# Altium footprint library CUSTOM PCB.PcbLib: 404 footprints (part 1 of 26)
Each footprint in its own frame and in the unit in brackets; x right, y up, seen from the top. Pads: shape width x height; smd on the part's side, far side on the other; paste and mask are expansions set on the pad; w line width, h text height; cw(c..) or ccw(c..) is an arc to the next point about the centre after c.
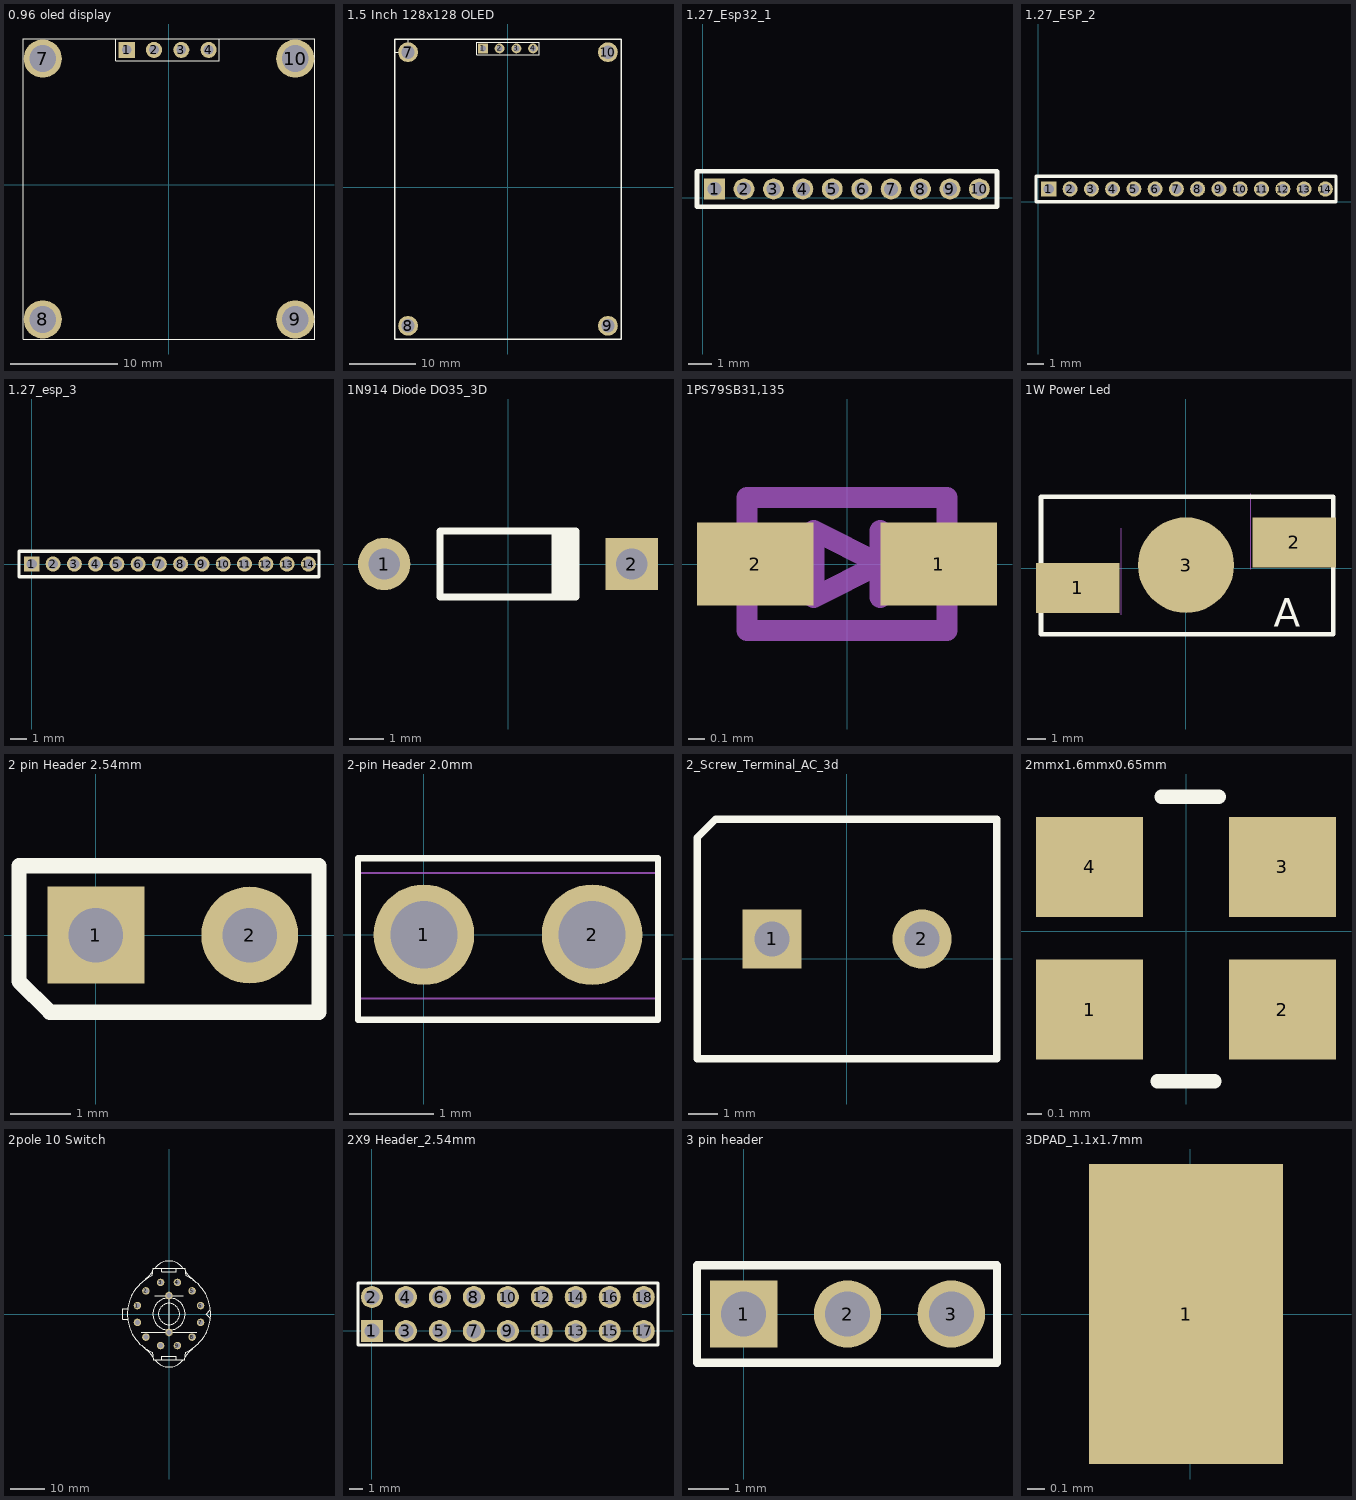
[diagram p0: the footprints below, top view; thin cyan lines are the x and y axes]

## 0.96 oled display [mm] "Connector; Header; 4 Position"
pads (8):
  rect 1.5x1.5 hole 0.9: 1(-3.937,12.547)
  round 1.5 hole 0.9: 2(-1.397,12.547) 3(1.143,12.547) 4(3.683,12.547)
  round 3.556 hole 2.5: 7(-11.759,11.734) 8(-11.759,-12.547) 9(11.759,-12.547) 10(11.759,11.734)
Top Overlay:
  lines w0.05: 11.303,11.734 11.505,11.734
  lines w0.1: -3.937,13.563 -13.589,13.563 ; -13.589,13.563 13.589,13.563 13.589,-14.377 -13.589,-14.377 -13.589,13.563 ; -4.953,11.531 -4.953,13.563 4.699,13.563 4.699,11.531 -4.953,11.531

## 1.5 Inch 128x128 OLED [mm] "Connector; Header; 4 Position"
pads (8):
  rect 1.5x1.5 hole 0.9: 1(-3.81,21.035)
  round 1.5 hole 0.9: 2(-1.27,21.035) 3(1.27,21.035) 4(3.81,21.035)
  round 3 hole 2: 7(-15.15,20.465) 8(-15.15,-21.035) 9(15.15,-21.035) 10(15.15,20.465)
Top Overlay:
  lines w0.1: -17.15,20.465 -15.15,20.465 -15.15,22.465 ; -4.75,20.066 4.75,20.066 4.75,21.971 -4.75,21.971 -4.75,20.066
  lines w0.2: -17.15,-23.035 -17.15,22.465 17.15,22.465 17.15,-23.035 -17.15,-23.035

## 1.27_Esp32_1 [mm] "10 pin 1.27mm Pitch esp32_1"
pads (10):
  rect 0.9x0.9 hole 0.6: 1(0.508,0.381)
  round 0.9 hole 0.6: 2(1.778,0.381) 3(3.048,0.381) 4(4.318,0.381) 5(5.588,0.381) 6(6.858,0.381) 7(8.128,0.381) 8(9.398,0.381) 9(10.668,0.381) 10(11.938,0.381)
Top Overlay:
  lines w0.2: -0.254,-0.381 12.7,-0.381 12.7,1.143 -0.254,1.143 -0.254,-0.381

## 1.27_ESP_2 [mm] "1.27mm pack, front left 14 pin connector"
pads (14):
  rect 0.9x0.9 hole 0.6: 1(0.635,0.762)
  round 0.9 hole 0.6: 2(1.905,0.762) 3(3.175,0.762) 4(4.445,0.762) 5(5.715,0.762) 6(6.985,0.762) 7(8.255,0.762) 8(9.525,0.762) 9(10.795,0.762) 10(12.065,0.762) 11(13.335,0.762) 12(14.605,0.762) 13(15.875,0.762) 14(17.145,0.762)
Top Overlay:
  lines w0.2: -0.127,0 -0.127,1.524 17.78,1.524 17.78,0 -0.127,0

## 1.27_esp_3 [mm] "front_right esp soc 1.27 pack headers"
pads (14):
  rect 0.9x0.9 hole 0.6: 1(0,0)
  round 0.9 hole 0.6: 2(1.27,0) 3(2.54,0) 4(3.81,0) 5(5.08,0) 6(6.35,0) 7(7.62,0) 8(8.89,0) 9(10.16,0) 10(11.43,0) 11(12.7,0) 12(13.97,0) 13(15.24,0) 14(16.51,0)
Top Overlay:
  lines w0.2: -0.762,-0.762 17.145,-0.762 17.145,0.762 -0.762,0.762 -0.762,-0.762

## 1N914 Diode DO35_3D [mm] "1n914 diode with 3d pac"
pads (2):
  round 1.5 hole 0.9: 1(-3.55,0)
  rect 1.5x1.5 hole 0.9: 2(3.55,0)
Top Overlay:
  rectangle: 1.25,-0.95 2.05,0.95
  lines w0.2: 1.95,-0.95 -1.95,-0.95 -1.95,0.95 1.95,0.95
3D body: height 0.25, standoff 0, extent -0.762,0.127 -0.762,0.127
3D body: height 0.25, standoff 0, extent -0.762,0.127 -0.762,0.127
3D body: height 0.25, standoff 0, extent -4.064,-3.048 -4.064,-3.048
3D body: height 0.25, standoff 0, extent -1.397,0.508 -1.397,0.508
3D body "DO-35_7mm.STEP": height 2.2, standoff -0.7, extent -3.78,-0.925 3.78,0.925

## 1PS79SB31,135 [mm]
pads (2):
  rect 0.7x0.5 smd: 1(0.55,0) 2(-0.55,0)
Mechanical 4:
  region: 0.6,0.15 0.8,0.15 0.8,-0.15 0.6,-0.15
  region: -0.801,0.15 -0.6,0.15 -0.6,-0.15 -0.801,-0.15
  region: 0.6,0.15 0.8,0.15 0.8,-0.15 0.6,-0.15
  region: -0.801,0.15 -0.6,0.15 -0.6,-0.15 -0.801,-0.15
  lines w0.127: -0.6,-0.4 0.6,-0.4 ; -0.6,-0.4 -0.6,0.4 ; -0.6,-0.4 0.6,-0.4 ; -0.6,-0.4 -0.6,0.4 ; -0.6,0.4 0.6,0.4 ; -0.6,0.4 0.6,0.4 ; -0.2,-0.2 0.2,0 ; -0.2,-0.2 -0.2,0.2 ; -0.2,-0.2 0.2,0 ; -0.2,-0.2 -0.2,0.2 ; -0.2,0.2 0.2,0 ; -0.2,0.2 0.2,0 ; 0.2,0 0.2,-0.2 0.2,0 ; 0.2,0 0.2,0.2 0.2,0 ; 0.6,-0.4 0.6,0.4 ; 0.6,-0.4 0.6,0.4

## 1W Power Led [mm]
pads (3):
  rect 4.5x2.7 smd: 1(-5.791,-1.047) 2(5.842,1.403)
  round 5.15 smd: 3(0.025,0.178)
Top Overlay:
  lines w0.254: -7.772,-3.531 -7.772,3.861 7.95,3.861 7.95,-3.531 -7.772,-3.531
  text "A" at 4.75,-3.124 h1.52
Mechanical 4:
  lines w0.025: -3.454,-2.489 -3.454,2.159 ; 3.505,-0.051 3.505,4.013
3D body "Power Led.stp": height 5.05, standoff 0, extent -7.275,-3.823 7.625,4.127

## 2 pin Header 2.54mm [mm]
pads (2):
  rect 1.6x1.6 hole 0.9: 1(0,0)
  round 1.6 hole 0.9: 2(2.54,0)
Top Overlay:
  lines w0.254: -1.27,-0.762 -0.762,-1.27 3.683,-1.27 3.683,1.143 -1.27,1.143 -1.27,-0.762
3D body: height 0.25, standoff 0, extent 0.635,-0.889 0.635,-0.889
3D body "User Library-2PIN.SLDPRT": height 8.1, standoff -2.9, extent -1.27,-1.27 3.81,1.27

## 2-pin Header 2.0mm [mm]
pads (2):
  round 1.2 hole 0.8: 1(0,0) 2(2.007,0)
Top Overlay:
  lines w0.076: -0.787,-1.016 -0.787,0.914 2.794,0.914 2.794,-1.016 -0.787,-1.016
Mechanical 1:
  lines w0.025: -0.787,-0.762 2.794,-0.762 2.794,0.737 -0.787,0.737 -0.787,-0.762

## 2_Screw_Terminal_AC_3d [mm]
pads (2):
  rect 2x2 hole 1.2: 1(-2.538,0.666)
  round 2 hole 1.2: 2(2.542,0.666)
Top Overlay:
  lines w0.254: -5.078,-3.398 -5.078,4.095 -4.443,4.73 5.082,4.73 5.082,-3.398 -5.078,-3.398
3D body "Screw Terminal Block 5mm.SLDPRT": height 12.6, standoff -4.3, extent -5.046,-3.793 5.554,5.207
3D body: height 0.25, standoff 0, extent 0.002,0.666 0.002,0.666

## 2mmx1.6mmx0.65mm [mm]
pads (4):
  rect 0.75x0.7 smd: 1(-0.675,-0.55) 2(0.675,-0.55) 3(0.675,0.45) 4(-0.675,0.45)
Top Overlay:
  lines w0.1: -0.2,-1.05 0.2,-1.05 ; -0.171,0.94 0.229,0.94
  text "." at -1.397,-0.61 h0.8
3D body "User Library-XRCGB27M000F2P00R0.X_T": height 0.65, standoff 0, extent -1,-0.749 1,0.851

## 2pole 10 Switch [mil]
pads (14):
  round 86 hole 59.06: 1(-361.27,96.8) 2(-264.47,264.47) 3(-96.8,361.27) 4(96.8,361.27) 5(264.47,264.47) 6(361.27,96.8) 7(361.27,-96.8) 8(264.47,-264.47) 9(96.8,-361.27) 10(-96.8,-361.27) 11(-264.47,-264.47) 12(-361.27,-96.8) 13(-1,211) 15(0,-210)
Top Overlay:
  circle w8: c0,0 r184.06
  circle w8: c0,0 r121.06
  lines w1: -316,-210 318,-210 0,-210 ; -162,211 161,211 -1,211 ; 0,-255 0,255.89
  lines w8: -478.35,58.07 -530.51,58.07 -530.51,-58.07 -476.38,-58.07 ; -277.35,-387.99 cw(c-800.75,-949.26) -187.84,-487.4 ; -277.35,387.99 ccw(c-800.75,949.26) -187.84,487.4 ; -194.14,-436.59 cw(c0,-0.55) -194.14,435.48 ; -192.91,436.02 -180.12,524.61 180.12,524.61 191.93,437.99 ; -191.93,-437.99 -180.12,-524.61 180.12,-524.61 192.91,-436.02 ; -155.25,-528.9 ccw(c0,-411.91) 155.25,-528.9 ; -155.25,528.9 cw(c0,411.91) 155.25,528.9 ; -80.71,-520.67 -80.71,-485.24 80.71,-485.24 80.71,-520.67 ; -80.71,520.67 -80.71,485.24 80.71,485.24 80.71,520.67 ; 187.84,-487.4 cw(c800.75,-949.26) 277.35,-387.99 ; 187.84,487.4 ccw(c800.75,949.26) 277.35,387.99 ; 194.14,-435.48 ccw(c0,0.55) 194.14,436.59 ; 473.43,-47.24 426.18,0 473.43,47.24

## 2X9 Header_2.54mm [mm]
pads (18):
  rect 1.65x1.65 / inner round 1.65 / far side rect 1.65x1.65 hole 1.1: 1(0,0)
  round 1.65 hole 1.1: 2(0,2.54) 3(2.54,0) 4(2.54,2.54) 5(5.08,0) 6(5.08,2.54) 7(7.62,0) 8(7.62,2.54) 9(10.16,0) 10(10.16,2.54) 11(12.7,0) 12(12.7,2.54) 13(15.24,0) 14(15.24,2.54) 15(17.78,0) 16(17.78,2.54) 17(20.32,0) 18(20.32,2.54)
Top Overlay:
  lines w0.2: -1.041,-1.041 -1.041,3.581 21.387,3.581 21.387,-1.041 -1.041,-1.041

## 3 pin header [mm]
pads (3):
  rect 1.65x1.65 / inner round 1.65 / far side rect 1.65x1.65 hole 1.1: 1(0,0)
  round 1.65 hole 1.1: 2(2.54,0) 3(5.08,0)
Top Overlay:
  lines w0.2: -1.143,-1.194 6.198,-1.194 6.198,1.194 -1.143,1.194 -1.143,-1.194

## 3DPAD_1.1x1.7mm [mm] "3DPAD_1.1x1.7mm"
pads (1):
  rect 1.1x1.7 smd: 1(-0.025,0)
3D body: height 0.13, standoff 0, extent -0.66,-0.94 0.61,0.94